# Altium footprint library Altium_Lib.PcbLib: 334 footprints (part 2 of 21)
Each footprint in its own frame and in the unit in brackets; x right, y up, seen from the top. Pads: shape width x height; smd on the part's side, far side on the other; paste and mask are expansions set on the pad; w line width, h text height; cw(c..) or ccw(c..) is an arc to the next point about the centre after c.
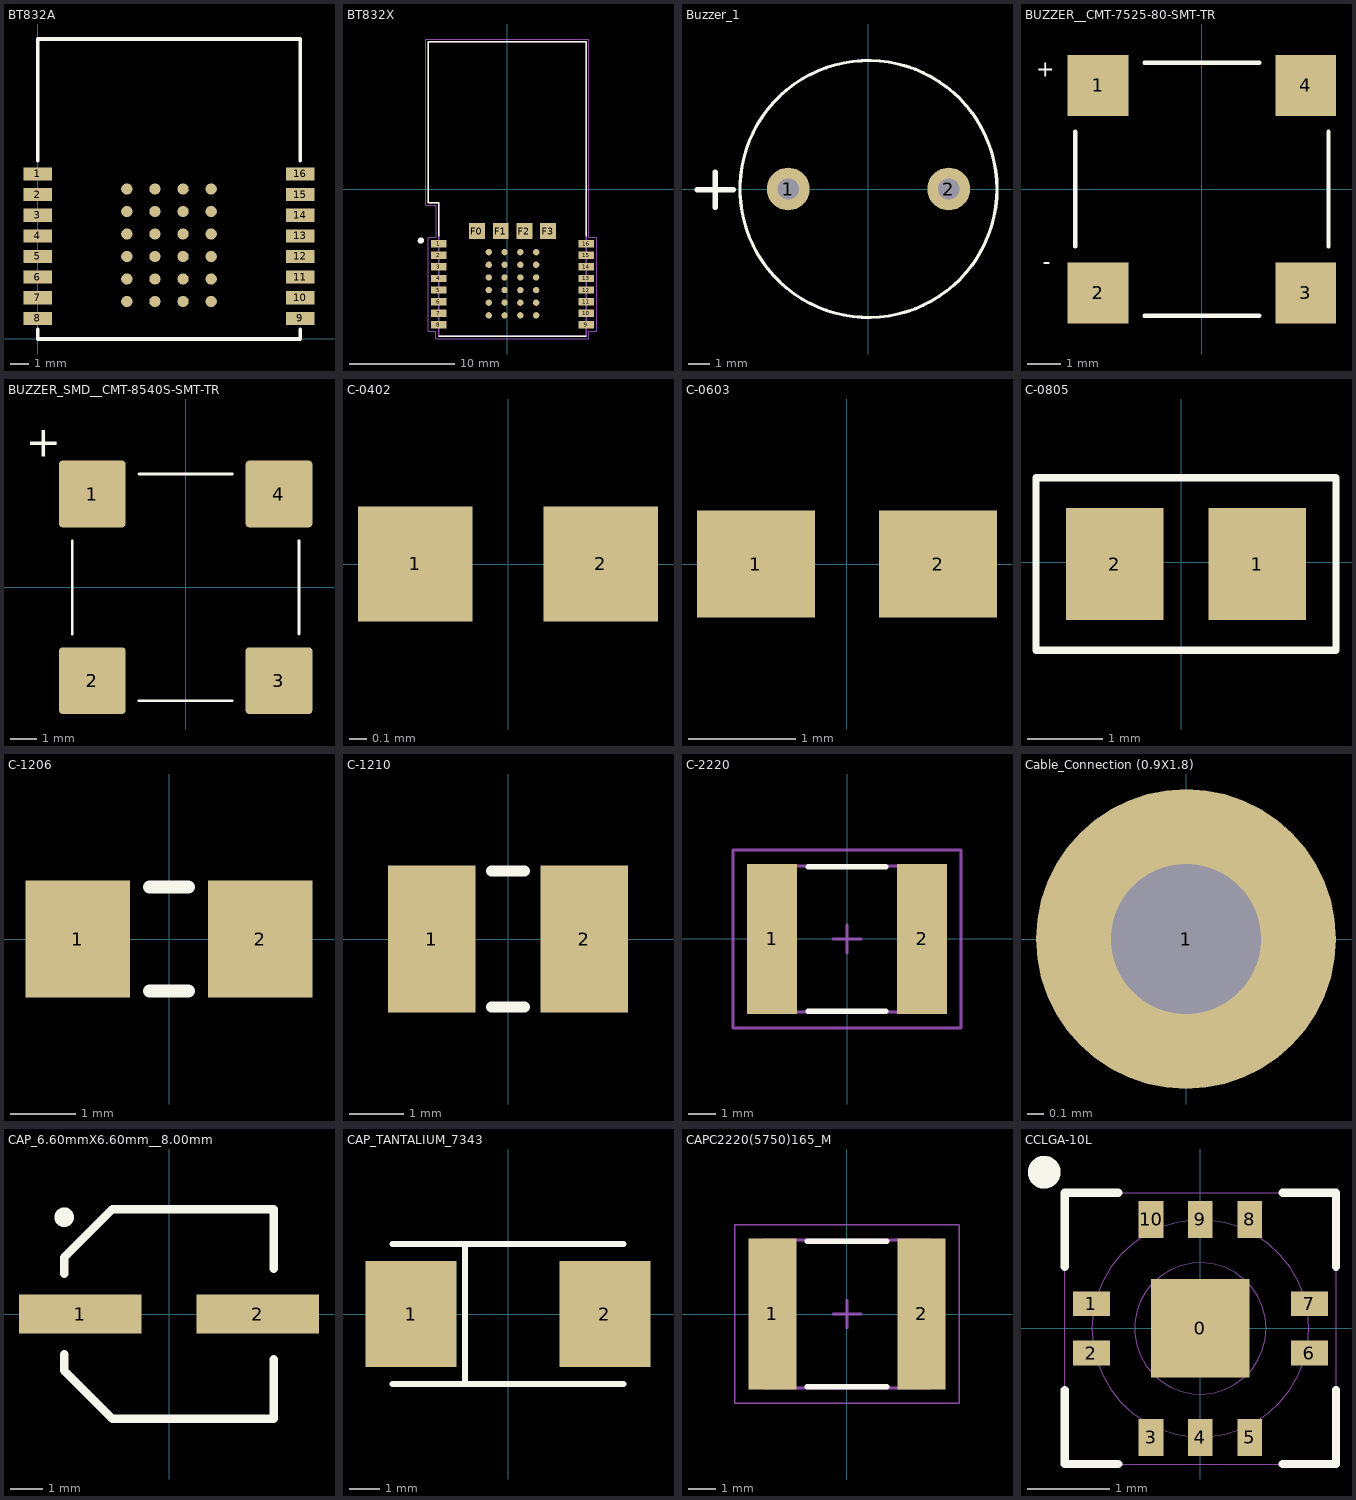
[diagram p1: the footprints below, top view; thin cyan lines are the x and y axes]

## BT832A [mm]
pads (40):
  rect 1.5x0.7 smd: 1(0,8.8) 2(0,7.7) 3(0,6.6) 4(0,5.5) 5(0,4.4) 6(0,3.3) 7(0,2.2) 8(0,1.1) 9(14,1.1) 10(14,2.2) 11(14,3.3) 12(14,4.4) 13(14,5.5) 14(14,6.6) 15(14,7.7) 16(14,8.8)
  rrect100% 0.6x0.6 smd: PA0(4.75,8) PA1(4.75,6.8) PA2(4.75,5.6) PA3(4.75,4.4) PA4(4.75,3.2) PA5(4.75,2) PB0(6.25,8) PB1(6.25,6.8) PB2(6.25,5.6) PB3(6.25,4.4) PB4(6.25,3.2) PB5(6.25,2) PC0(7.75,8) PC1(7.75,6.8) PC2(7.75,5.6) PC3(7.75,4.4) PC4(7.75,3.2) PC5(7.75,2) PD0(9.25,8) PD1(9.25,6.8) PD2(9.25,5.6) PD3(9.25,4.4) PD4(9.25,3.2) PD5(9.25,2)
Top Overlay:
  lines w0.001: 0,0.15 0,0 ; 14,16 14.003,16 ; 0,0 0,-0.001 12.599,-0.001 12.599,0 0,0
  lines w0.127: 0,0 13.157,0
  lines w0.2: -0.005,0.003 -0.005,0.5 ; -0.003,-0.001 13.997,-0.001 ; 0,9.5 0,16 14,16 14,9.5 ; 14,0.01 14,0.5
3D body "BT840E--3DModel-STEP-56544.STEP": height 1.9, standoff 0, extent 0,0 14,16

## BT832X [mm]
pads (44):
  rect 1.5x0.7 smd: 1(-6.5,-5.2) 2(-6.5,-6.3) 3(-6.5,-7.4) 4(-6.5,-8.5) 5(-6.5,-9.6) 6(-6.5,-10.7) 7(-6.5,-11.8) 8(-6.5,-12.9) 9(7.5,-12.9) 10(7.5,-11.8) 11(7.5,-10.7) 12(7.5,-9.6) 13(7.5,-8.5) 14(7.5,-7.4) 15(7.5,-6.3) 16(7.5,-5.2)
  round 0.6 smd: D1(2.75,-7.2) D2(2.75,-8.4) D3(2.75,-9.6) D4(2.75,-10.8) D5(2.75,-12) PA0(-1.75,-6) PA1(-1.75,-7.2) PA2(-1.75,-8.4) PA3(-1.75,-9.6) PA4(-1.75,-10.8) PA5(-1.75,-12) PB0(-0.25,-6) PB1(-0.25,-7.2) PB2(-0.25,-8.4) PB3(-0.25,-9.6) PB4(-0.25,-10.8) PB5(-0.25,-12) PC0(1.25,-6) PC1(1.25,-7.2) PC2(1.25,-8.4) PC3(1.25,-9.6) PC4(1.25,-10.8) PC5(1.25,-12) PD0(2.75,-6)
  rect 1.5x1.5 smd: F0(-2.87,-4) F1(-0.62,-4) F2(1.63,-4) F3(3.88,-4)
Top Overlay:
  circle w0.3: c-8.2,-4.9 r0.15
  lines w0.127: -6.5,-14 7.5,-14 ; -6.5,-4.5 -6.5,-1.3 -7.5,-1.3 -7.5,14 7.5,14 7.5,-4.5
Mechanical 4:
  lines w0.127: -7.5,-1.3 -6.5,-1.3 ; -7.5,-1.3 -7.5,14 ; -7.5,-1.3 -6.5,-1.3 ; -7.5,-1.3 -7.5,14 ; -7.5,14 7.5,14 ; -7.5,14 7.5,14 ; -6.5,-14 -6.5,-1.3 ; -6.5,-14 7.5,-14 ; -6.5,-14 -6.5,-1.3 ; -6.5,-14 7.5,-14 ; 7.5,-14 7.5,14 ; 7.5,-14 7.5,14
Mechanical 16:
  lines w0.05: -7.75,-1.55 -6.75,-1.55 -6.75,-4.6 -7.5,-4.6 -7.5,-13.5 -6.765,-13.5 -6.765,-14.25 7.735,-14.25 7.735,-13.5 8.5,-13.5 8.5,-4.6 7.75,-4.6 7.75,14.25 -7.75,14.25 -7.75,-1.55
3D body "bt832x_1211 (1).stp": height -0.5, standoff -2.35, extent -7.5,-14 7.5,14

## Buzzer_1 [mil]
height 400
pads (2):
  round 80 hole 40: 1(-150,0) 2(150,0)
Top Overlay:
  circle w6: c0,0 r240.16
  lines w10: -320.48,-1.58 -252.48,-1.58 ; -286.48,-34.58 -286.48,31.42
3D body "Buzzer_02.step": height 290.75, standoff -224.25, extent -232.99,-233 233,233

## BUZZER__CMT-7525-80-SMT-TR [mm]
pads (4):
  rect 1.8x1.8 smd: 1(-3.075,3.075) 2(-3.075,-3.075) 3(3.075,-3.075) 4(3.075,3.075)
Top Overlay:
  lines w0.127: -3.75,-1.7 -3.75,1.7 ; -1.7,-3.75 1.7,-3.75 ; -1.7,3.75 1.7,3.75 ; 3.75,-1.7 3.75,1.7
  text "+" at -4.915,3.175 h0.81
  text "-" at -4.715,-2.54 h0.81
3D body "CUI_DEVICES_CMT-7525-80-SMT-TR.step": height 2.5, standoff 0, extent -3.875,-3.7 3.625,3.8

## BUZZER_SMD__CMT-8540S-SMT-TR [mm]
pads (4):
  rrect10% 2.5x2.5 smd mask+0.05: 1(-3.5,3.5) 2(-3.5,-3.5) 3(3.5,-3.5) 4(3.5,3.5)
Top Overlay:
  lines w0.1: -4.25,-1.75 -4.25,1.75 ; -1.75,-4.25 1.75,-4.25 ; -1.75,4.25 1.75,4.25 ; 4.25,-1.75 4.25,1.75
  text "+" at -6,4.5 h2
3D body "CUI_CMT-8540S-SMT.step": height 4, standoff 0, extent -4.25,-4.25 4.25,4.25

## C-0402 [mm] "Chip Capacitor; Body 1.0 x 0.5 mm (LxW typ)"
height 0.6
pads (2):
  rect 0.65x0.65 smd: 1(-0.525,0) 2(0.525,0)
3D body "0402_C.step": height 0.36, standoff 0, extent -0.5,-0.265 0.5,0.265

## C-0603 [mm] "Chip Capacitor; Body 1.6 x 0.8 mm (LxW typ)"
height 0.85
pads (2):
  rect 1.1x1 smd: 1(-0.85,0) 2(0.85,0)
3D body "0603_C.step": height 0.79, standoff 0, extent -0.8,-0.43 0.8,0.43

## C-0805 [mm] "Chip Resistor; Body 2.0 x 1.3 mm (LxW typ)"
height 0.65
pads (2):
  rect 1.3x1.5 smd: 1(1.016,-0.025) 2(-0.884,-0.025)
Top Overlay:
  lines w0.1: -1.934,-1.175 2.066,-1.175 2.066,1.125 -1.934,1.125 -1.934,-1.175
3D body "0805_C.STEP": height 0.78, standoff 0, extent -0.934,-0.651 1.066,0.599

## C-1206 [mm] "Chip Resistor; Body 3.2 x 1.6 mm (LxW typ)"
height 1
pads (2):
  rect 1.6x1.8 smd: 1(-1.4,0) 2(1.4,0)
Top Overlay:
  lines w0.2: -0.3,-0.8 0.3,-0.8 ; -0.3,0.8 0.3,0.8
3D body "1206_C.STEP": height 1, standoff 0, extent -1.6,-0.8 1.6,0.8

## C-1210 [mm] "Chip Resistor; Body 3.2 x 2.5 mm (LxW typ)"
height 1
pads (2):
  rect 1.6x2.7 smd: 1(-1.4,0) 2(1.4,0)
Top Overlay:
  lines w0.2: -0.3,-1.25 0.3,-1.25 ; -0.3,1.25 0.3,1.25

## C-2220 [mm] "Chip Capacitor, Body 5.7x5.0mm, IPC Low Density"
height 2.5
pads (2):
  rect 1.8x5.4 smd: 1(-2.7,0) 2(2.7,0)
Top Overlay:
  lines w0.2: -1.4,-2.6 1.4,-2.6 ; -1.4,2.6 1.4,2.6
Mechanical 13:
  lines w0.1: -2.95,-2.625 -2.95,2.625 2.95,2.625 2.95,-2.625 -2.95,-2.625
Mechanical 15:
  lines w0.1: -0.5,0 0.5,0 ; 0,-0.5 0,0.5 ; -4.1,-3.2 -4.1,3.2 4.1,3.2 4.1,-3.2 -4.1,-3.2
3D body "CAP_5750.stp": height 1.24, standoff 0, extent -3.048,-2.705 3.048,2.705

## Cable_Connection (0.9X1.8) [mm] "(H_0.90mmX D1.80mm))"
pads (1):
  round 1.8 hole 0.9: 1(0,0)

## CAP_6.60mmX6.60mm__8.00mm [mm]
pads (2):
  rect 3.8x1.2 smd: 1(-2.75,0) 2(2.75,0)
Top Overlay:
  circle w0.305: c-3.25,3 r0.152
  lines w0.254: -3.25,-1.25 -3.25,-1.75 -1.75,-3.25 3.25,-3.25 3.25,-1.4 ; -3.25,1.25 -3.25,1.75 -1.75,3.25 3.25,3.25 3.25,1.4
3D body "User Library-CEL63D66S8H.step": height 7.7, standoff 0, extent -3.5,-3.3 3.5,3.3

## CAP_TANTALIUM_7343 [mm] "7.43mm X 4.43mm"
height 4.2
pads (2):
  rect 3x3.5 smd: 1(-3.2,0) 2(3.2,0)
Top Overlay:
  lines w0.203: -3.81,-2.311 3.81,-2.311 ; -3.81,2.311 3.81,2.311 ; -1.417,-2.311 -1.417,2.311
3D body "Tantalum_D_7343.STEP": height 3.1, standoff 0, extent -3.931,-2.305 3.931,2.305

## CAPC2220(5750)165_M [mm]
pads (2):
  rect 1.75x5.5 smd: 1(-2.725,0) 2(2.725,0)
Top Overlay:
  lines w0.2: -1.45,-2.65 1.45,-2.65 ; -1.45,2.65 1.45,2.65
Mechanical 13:
  lines w0.1: -3.05,-2.7 -3.05,2.7 3.05,2.7 3.05,-2.7 -3.05,-2.7
Mechanical 15:
  lines w0.05: -4.1,-3.25 -4.1,3.25 4.1,3.25 4.1,-3.25 -4.1,-3.25
  lines w0.1: -0.5,0 0.5,0 ; 0,-0.5 0,0.5
3D body: height 1.65, standoff 0, extent -2.45,-2.7 2.45,2.7
3D body: height 1.65, standoff 0, extent -3.05,-2.7 -2.45,2.7
3D body: height 1.65, standoff 0, extent 2.45,-2.7 3.05,2.7

## CCLGA-10L [mm] "CCLGA - 10L (3.3 x 3.3 x max 2.9 mm)"
height 2.9
pads (11):
  rect 1.2x1.2 smd mask+0.05: 0(0,0)
  rect 0.45x0.3 smd mask+0.05: 1(-1.325,0.3) 2(-1.325,-0.3) 6(1.325,-0.3) 7(1.325,0.3)
  rect 0.3x0.45 smd mask+0.05: 3(-0.6,-1.325) 4(0,-1.325) 5(0.6,-1.325) 8(0.6,1.325) 9(0,1.325) 10(-0.6,1.325)
Top Overlay:
  circle w0.2: c-1.9,1.9 r0.1
  lines w0.1: -1.65,-0.75 -1.65,-1.65 -1,-1.65 ; -1.65,0.75 -1.65,1.65 -1,1.65 ; 1,-1.65 1.65,-1.65 1.65,-0.75 ; 1,1.65 1.65,1.65 1.65,0.75
Mechanical 27:
  circle w0.01: c0,0 r1.32
  circle w0.01: c0,0 r0.8
  lines w0.01: -1.65,-1.65 1.65,-1.65 1.65,1.65 -1.65,1.65 -1.65,-1.65
3D body: height 0.7, standoff 0.05, extent -1.655,-1.655 1.655,1.655
3D body: height 2.7, standoff 0.2, extent -1.319,-1.319 1.319,1.319